# Altium integrated library Altium_WCAP-FTX2 (rev22a).IntLib: 106 symbols (part 1 of 2) (continued)
## 890324025007
designator C?, comment 39nF  (value not drawn)
WCAP-FTX2 Film Capacitor, THT, L18W5H11mm, 39nF, 275VAC; Manufacturer: Wurth Elektronik; Manufacturer Part Number: 890324025007; Capacitance Tolerance: +/-10%; Dissipation Factor @1kHz: 0.1%; Dissipation Factor @100kHz: 0.5%; Insulation Resistance: 30000MOhm; Pitch: 15mm; Rate of Voltage Rise: 300V/us; Rated Voltage (AC): 275V; Technical Reference: MX2P015393K275ASPB15000; ComponentLink1Description: Manufacturer Link; ComponentLink1URL: https://www.we-online.com/redexpert/article/890324025007?ad; ComponentLink2Description: Datasheet; ComponentLink2URL: https://www.we-online.com/redexpert/spec/890324025007?ad; Category: Film Capacitors; Match Code: WCAP-FTX2; Mount: Through Hole; Operating Temperature Max: 105°C; Operating Temperature Min: -40°C; Packaging: Carton; Length: 18mm; Width: 5mm; Height: 11mm; Capacitance: 39nF; Dissipation Factor @10kHz: 0.1%
footprint WCAP-FTX2_L18W5H11
pins: 1, 2

## 890324025007CS
designator C?, comment 39nF  (value not drawn)
WCAP-FTX2 Film Capacitor, THT, L18W5H11mm, 39nF, 275VAC; Manufacturer: Wurth Elektronik; Manufacturer Part Number: 890324025007CS; Capacitance Tolerance: +/-10%; Dissipation Factor @1kHz: 0.1%; Dissipation Factor @100kHz: 0.5%; Insulation Resistance: 30000MOhm; Pitch: 15mm; Rate of Voltage Rise: 300V/us; Rated Voltage (AC): 275V; Technical Reference: MX2P015393K275ACPP45004; ComponentLink1Description: Manufacturer Link; ComponentLink1URL: https://www.we-online.com/redexpert/article/890324025007CS?ad; ComponentLink2Description: Datasheet; ComponentLink2URL: https://www.we-online.com/redexpert/spec/890324025007CS?ad; Category: Film Capacitors; Match Code: WCAP-FTX2; Mount: Through Hole; Operating Temperature Max: 105°C; Operating Temperature Min: -40°C; Packaging: Carton; Length: 18mm; Width: 5mm; Height: 11mm; Capacitance: 39nF; Dissipation Factor @10kHz: 0.1%
footprint WCAP-FTX2_L18W5H11_CS
pins: 1, 2

## 890324025009
designator C?, comment 47nF  (value not drawn)
WCAP-FTX2 Film Capacitor, THT, L18W5H11mm, 47nF, 275VAC; Manufacturer: Wurth Elektronik; Manufacturer Part Number: 890324025009; Capacitance Tolerance: +/-10%; Dissipation Factor @1kHz: 0.1%; Dissipation Factor @100kHz: 0.5%; Insulation Resistance: 30000MOhm; Pitch: 15mm; Rate of Voltage Rise: 220V/us; Rated Voltage (AC): 275V; Technical Reference: MX2P015473K275ASPB16000; ComponentLink1Description: Manufacturer Link; ComponentLink1URL: https://www.we-online.com/redexpert/article/890324025009?ad; ComponentLink2Description: Datasheet; ComponentLink2URL: https://www.we-online.com/redexpert/spec/890324025009?ad; Category: Film Capacitors; Match Code: WCAP-FTX2; Mount: Through Hole; Operating Temperature Max: 105°C; Operating Temperature Min: -40°C; Packaging: Carton; Length: 18mm; Width: 5mm; Height: 11mm; Capacitance: 47nF; Dissipation Factor @10kHz: 0.1%
footprint WCAP-FTX2_L18W5H11
pins: 1, 2

## 890324025009CS
designator C?, comment 47nF  (value not drawn)
WCAP-FTX2 Film Capacitor, THT, L18W5H11mm, 47nF, 275VAC; Manufacturer: Wurth Elektronik; Manufacturer Part Number: 890324025009CS; Capacitance Tolerance: +/-10%; Dissipation Factor @1kHz: 0.1%; Dissipation Factor @100kHz: 0.5%; Insulation Resistance: 30000MOhm; Pitch: 15mm; Rate of Voltage Rise: 220V/us; Rated Voltage (AC): 275V; Technical Reference: MX2P015473K275ACPP46004; ComponentLink1Description: Manufacturer Link; ComponentLink1URL: https://www.we-online.com/redexpert/article/890324025009CS?ad; ComponentLink2Description: Datasheet; ComponentLink2URL: https://www.we-online.com/redexpert/spec/890324025009CS?ad; Category: Film Capacitors; Match Code: WCAP-FTX2; Mount: Through Hole; Operating Temperature Max: 105°C; Operating Temperature Min: -40°C; Packaging: Carton; Length: 18mm; Width: 5mm; Height: 11mm; Capacitance: 47nF; Dissipation Factor @10kHz: 0.1%
footprint WCAP-FTX2_L18W5H11_CS
pins: 1, 2

## 890324025011
designator C?, comment 56nF  (value not drawn)
WCAP-FTX2 Film Capacitor, THT, L18W5H11mm, 56nF, 275VAC; Manufacturer: Wurth Elektronik; Manufacturer Part Number: 890324025011; Capacitance Tolerance: +/-10%; Dissipation Factor @1kHz: 0.1%; Dissipation Factor @100kHz: 0.5%; Insulation Resistance: 30000MOhm; Pitch: 15mm; Rate of Voltage Rise: 250V/us; Rated Voltage (AC): 275V; Technical Reference: MX2P015563K275ASPB16000; ComponentLink1Description: Manufacturer Link; ComponentLink1URL: https://www.we-online.com/redexpert/article/890324025011?ad; ComponentLink2Description: Datasheet; ComponentLink2URL: https://www.we-online.com/redexpert/spec/890324025011?ad; Category: Film Capacitors; Match Code: WCAP-FTX2; Mount: Through Hole; Operating Temperature Max: 105°C; Operating Temperature Min: -40°C; Packaging: Carton; Length: 18mm; Width: 5mm; Height: 11mm; Capacitance: 56nF; Dissipation Factor @10kHz: 0.1%
footprint WCAP-FTX2_L18W5H11
pins: 1, 2

## 890324025011CS
designator C?, comment 56nF  (value not drawn)
WCAP-FTX2 Film Capacitor, THT, L18W5H11mm, 56nF, 275VAC; Manufacturer: Wurth Elektronik; Manufacturer Part Number: 890324025011CS; Capacitance Tolerance: +/-10%; Dissipation Factor @1kHz: 0.1%; Dissipation Factor @100kHz: 0.5%; Insulation Resistance: 30000MOhm; Pitch: 15mm; Rate of Voltage Rise: 250V/us; Rated Voltage (AC): 275V; Technical Reference: MX2P015563K275ACPP46004; ComponentLink1Description: Manufacturer Link; ComponentLink1URL: https://www.we-online.com/redexpert/article/890324025011CS?ad; ComponentLink2Description: Datasheet; ComponentLink2URL: https://www.we-online.com/redexpert/spec/890324025011CS?ad; Category: Film Capacitors; Match Code: WCAP-FTX2; Mount: Through Hole; Operating Temperature Max: 105°C; Operating Temperature Min: -40°C; Packaging: Carton; Length: 18mm; Width: 5mm; Height: 11mm; Capacitance: 56nF; Dissipation Factor @10kHz: 0.1%
footprint WCAP-FTX2_L18W5H11_CS
pins: 1, 2

## 890324025013
designator C?, comment 68nF  (value not drawn)
WCAP-FTX2 Film Capacitor, THT, L18W6H12mm, 68nF, 275VAC; Manufacturer: Wurth Elektronik; Manufacturer Part Number: 890324025013; Capacitance Tolerance: +/-10%; Dissipation Factor @1kHz: 0.1%; Dissipation Factor @100kHz: 0.5%; Insulation Resistance: 30000MOhm; Pitch: 15mm; Rate of Voltage Rise: 270V/us; Rated Voltage (AC): 275V; Technical Reference: MX2P015683K275ASPB16000; ComponentLink1Description: Manufacturer Link; ComponentLink1URL: https://www.we-online.com/redexpert/article/890324025013?ad; ComponentLink2Description: Datasheet; ComponentLink2URL: https://www.we-online.com/redexpert/spec/890324025013?ad; Category: Film Capacitors; Match Code: WCAP-FTX2; Mount: Through Hole; Operating Temperature Max: 105°C; Operating Temperature Min: -40°C; Packaging: Carton; Length: 18mm; Width: 6mm; Height: 12mm; Capacitance: 68nF; Dissipation Factor @10kHz: 0.1%
footprint WCAP-FTX2_L18W6H12
pins: 1, 2

## 890324025013CS
designator C?, comment 68nF  (value not drawn)
WCAP-FTX2 Film Capacitor, THT, L18W6H12mm, 68nF, 275VAC; Manufacturer: Wurth Elektronik; Manufacturer Part Number: 890324025013CS; Capacitance Tolerance: +/-10%; Dissipation Factor @1kHz: 0.1%; Dissipation Factor @100kHz: 0.5%; Insulation Resistance: 30000MOhm; Pitch: 15mm; Rate of Voltage Rise: 270V/us; Rated Voltage (AC): 275V; Technical Reference: MX2P015683K275ACPP46004; ComponentLink1Description: Manufacturer Link; ComponentLink1URL: https://www.we-online.com/redexpert/article/890324025013CS?ad; ComponentLink2Description: Datasheet; ComponentLink2URL: https://www.we-online.com/redexpert/spec/890324025013CS?ad; Category: Film Capacitors; Match Code: WCAP-FTX2; Mount: Through Hole; Operating Temperature Max: 105°C; Operating Temperature Min: -40°C; Packaging: Carton; Length: 18mm; Width: 6mm; Height: 12mm; Capacitance: 68nF; Dissipation Factor @10kHz: 0.1%
footprint WCAP-FTX2_L18W6H12_CS
pins: 1, 2

## 890324025015
designator C?, comment 82nF  (value not drawn)
WCAP-FTX2 Film Capacitor, THT, L18W6H12mm, 82nF, 275VAC; Manufacturer: Wurth Elektronik; Manufacturer Part Number: 890324025015; Capacitance Tolerance: +/-10%; Dissipation Factor @1kHz: 0.1%; Dissipation Factor @100kHz: 0.5%; Insulation Resistance: 30000MOhm; Pitch: 15mm; Rate of Voltage Rise: 290V/us; Rated Voltage (AC): 275V; Technical Reference: MX2P015823K275ASPB16000; ComponentLink1Description: Manufacturer Link; ComponentLink1URL: https://www.we-online.com/redexpert/article/890324025015?ad; ComponentLink2Description: Datasheet; ComponentLink2URL: https://www.we-online.com/redexpert/spec/890324025015?ad; Category: Film Capacitors; Match Code: WCAP-FTX2; Mount: Through Hole; Operating Temperature Max: 105°C; Operating Temperature Min: -40°C; Packaging: Carton; Length: 18mm; Width: 6mm; Height: 12mm; Capacitance: 82nF; Dissipation Factor @10kHz: 0.1%
footprint WCAP-FTX2_L18W6H12
pins: 1, 2

## 890324025015CS
designator C?, comment 82nF  (value not drawn)
WCAP-FTX2 Film Capacitor, THT, L18W6H12mm, 82nF, 275VAC; Manufacturer: Wurth Elektronik; Manufacturer Part Number: 890324025015CS; Capacitance Tolerance: +/-10%; Dissipation Factor @1kHz: 0.1%; Dissipation Factor @100kHz: 0.5%; Insulation Resistance: 30000MOhm; Pitch: 15mm; Rate of Voltage Rise: 290V/us; Rated Voltage (AC): 275V; Technical Reference: MX2P015823K275ACPP46004; ComponentLink1Description: Manufacturer Link; ComponentLink1URL: https://www.we-online.com/redexpert/article/890324025015CS?ad; ComponentLink2Description: Datasheet; ComponentLink2URL: https://www.we-online.com/redexpert/spec/890324025015CS?ad; Category: Film Capacitors; Match Code: WCAP-FTX2; Mount: Through Hole; Operating Temperature Max: 105°C; Operating Temperature Min: -40°C; Packaging: Carton; Length: 18mm; Width: 6mm; Height: 12mm; Capacitance: 82nF; Dissipation Factor @10kHz: 0.1%
footprint WCAP-FTX2_L18W6H12_CS
pins: 1, 2

## 890324025017
designator C?, comment 100nF  (value not drawn)
WCAP-FTX2 Film Capacitor, THT, L18W6H12mm, 100nF, 275VAC; Manufacturer: Wurth Elektronik; Manufacturer Part Number: 890324025017; Capacitance Tolerance: +/-10%; Dissipation Factor @1kHz: 0.1%; Dissipation Factor @100kHz: 0.5%; Insulation Resistance: 30000MOhm; Pitch: 15mm; Rate of Voltage Rise: 300V/us; Rated Voltage (AC): 275V; Technical Reference: MX2P015104K275ASPB16000; ComponentLink1Description: Manufacturer Link; ComponentLink1URL: https://www.we-online.com/redexpert/article/890324025017?ad; ComponentLink2Description: Datasheet; ComponentLink2URL: https://www.we-online.com/redexpert/spec/890324025017?ad; Category: Film Capacitors; Match Code: WCAP-FTX2; Mount: Through Hole; Operating Temperature Max: 105°C; Operating Temperature Min: -40°C; Packaging: Carton; Length: 18mm; Width: 6mm; Height: 12mm; Capacitance: 100nF; Dissipation Factor @10kHz: 0.1%
footprint WCAP-FTX2_L18W6H12
pins: 1, 2

## 890324025017CS
designator C?, comment 100nF  (value not drawn)
WCAP-FTX2 Film Capacitor, THT, L18W6H12mm, 100nF, 275VAC; Manufacturer: Wurth Elektronik; Manufacturer Part Number: 890324025017CS; Capacitance Tolerance: +/-10%; Dissipation Factor @1kHz: 0.1%; Dissipation Factor @100kHz: 0.5%; Insulation Resistance: 30000MOhm; Pitch: 15mm; Rate of Voltage Rise: 300V/us; Rated Voltage (AC): 275V; Technical Reference: MX2P015104K275ACPP46004; ComponentLink1Description: Manufacturer Link; ComponentLink1URL: https://www.we-online.com/redexpert/article/890324025017CS?ad; ComponentLink2Description: Datasheet; ComponentLink2URL: https://www.we-online.com/redexpert/spec/890324025017CS?ad; Category: Film Capacitors; Match Code: WCAP-FTX2; Mount: Through Hole; Operating Temperature Max: 105°C; Operating Temperature Min: -40°C; Packaging: Carton; Length: 18mm; Width: 6mm; Height: 12mm; Capacitance: 100nF; Dissipation Factor @10kHz: 0.1%
footprint WCAP-FTX2_L18W6H12_CS
pins: 1, 2

## 890324025020
designator C?, comment 120nF  (value not drawn)
WCAP-FTX2 Film Capacitor, THT, L18W7.5H13.5mm, 120nF, 275VAC; Manufacturer: Wurth Elektronik; Manufacturer Part Number: 890324025020; Capacitance Tolerance: +/-10%; Dissipation Factor @1kHz: 0.1%; Dissipation Factor @10kHz: 0.2%; Dissipation Factor @100kHz: 2%; Insulation Resistance: 30000MOhm; Pitch: 15mm; Rate of Voltage Rise: 300V/us; Rated Voltage (AC): 275V; Technical Reference: MX2P015124K275ASPB16000; ComponentLink1Description: Manufacturer Link; ComponentLink1URL: https://www.we-online.com/redexpert/article/890324025020?ad; ComponentLink2Description: Datasheet; ComponentLink2URL: https://www.we-online.com/redexpert/spec/890324025020?ad; Category: Film Capacitors; Match Code: WCAP-FTX2; Mount: Through Hole; Operating Temperature Max: 105°C; Operating Temperature Min: -40°C; Packaging: Carton; Length: 18mm; Width: 7.5mm; Height: 13.5mm; Capacitance: 120nF
footprint WCAP-FTX2_L18W7.5H13.5
pins: 1, 2

## 890324025020CS
designator C?, comment 120nF  (value not drawn)
WCAP-FTX2 Film Capacitor, THT, L18W7.5H13.5mm, 120nF, 275VAC; Manufacturer: Wurth Elektronik; Manufacturer Part Number: 890324025020CS; Capacitance Tolerance: +/-10%; Dissipation Factor @1kHz: 0.1%; Dissipation Factor @10kHz: 0.2%; Dissipation Factor @100kHz: 2%; Insulation Resistance: 30000MOhm; Pitch: 15mm; Rate of Voltage Rise: 300V/us; Rated Voltage (AC): 275V; Technical Reference: MX2P015124K275ACPP46004; ComponentLink1Description: Manufacturer Link; ComponentLink1URL: https://www.we-online.com/redexpert/article/890324025020CS?ad; ComponentLink2Description: Datasheet; ComponentLink2URL: https://www.we-online.com/redexpert/spec/890324025020CS?ad; Category: Film Capacitors; Match Code: WCAP-FTX2; Mount: Through Hole; Operating Temperature Max: 105°C; Operating Temperature Min: -40°C; Packaging: Carton; Length: 18mm; Width: 7.5mm; Height: 13.5mm; Capacitance: 120nF
footprint WCAP-FTX2_L18W7.5H13.5_CS
pins: 1, 2

## 890324025022
designator C?, comment 150nF  (value not drawn)
WCAP-FTX2 Film Capacitor, THT, L18W6H12mm, 150nF, 275VAC; Manufacturer: Wurth Elektronik; Manufacturer Part Number: 890324025022; Capacitance Tolerance: +/-10%; Dissipation Factor @1kHz: 0.1%; Dissipation Factor @10kHz: 0.2%; Dissipation Factor @100kHz: 2%; Insulation Resistance: 30000MOhm; Pitch: 15mm; Rate of Voltage Rise: 210V/us; Rated Voltage (AC): 275V; Technical Reference: MX2P015154K275ASPB16000; ComponentLink1Description: Manufacturer Link; ComponentLink1URL: https://www.we-online.com/redexpert/article/890324025022?ad; ComponentLink2Description: Datasheet; ComponentLink2URL: https://www.we-online.com/redexpert/spec/890324025022?ad; Category: Film Capacitors; Match Code: WCAP-FTX2; Mount: Through Hole; Operating Temperature Max: 105°C; Operating Temperature Min: -40°C; Packaging: Carton; Length: 18mm; Width: 6mm; Height: 12mm; Capacitance: 150nF
footprint WCAP-FTX2_L18W6H12
pins: 1, 2

## 890324025022CS
designator C?, comment 150nF  (value not drawn)
WCAP-FTX2 Film Capacitor, THT, L18W6H12mm, 150nF, 275VAC; Manufacturer: Wurth Elektronik; Manufacturer Part Number: 890324025022CS; Capacitance Tolerance: +/-10%; Dissipation Factor @1kHz: 0.1%; Dissipation Factor @10kHz: 0.2%; Dissipation Factor @100kHz: 2%; Insulation Resistance: 30000MOhm; Pitch: 15mm; Rate of Voltage Rise: 210V/us; Rated Voltage (AC): 275V; Technical Reference: MX2P015154K275ACPP46004; ComponentLink1Description: Manufacturer Link; ComponentLink1URL: https://www.we-online.com/redexpert/article/890324025022CS?ad; ComponentLink2Description: Datasheet; ComponentLink2URL: https://www.we-online.com/redexpert/spec/890324025022CS?ad; Category: Film Capacitors; Match Code: WCAP-FTX2; Mount: Through Hole; Operating Temperature Max: 105°C; Operating Temperature Min: -40°C; Packaging: Carton; Length: 18mm; Width: 6mm; Height: 12mm; Capacitance: 150nF
footprint WCAP-FTX2_L18W6H12_CS
pins: 1, 2

## 890324025025
designator C?, comment 180nF  (value not drawn)
WCAP-FTX2 Film Capacitor, THT, L18W6H12mm, 180nF, 275VAC; Manufacturer: Wurth Elektronik; Manufacturer Part Number: 890324025025; Capacitance Tolerance: +/-10%; Dissipation Factor @1kHz: 0.1%; Dissipation Factor @10kHz: 0.2%; Dissipation Factor @100kHz: 2%; Insulation Resistance: 30000MOhm; Pitch: 15mm; Rate of Voltage Rise: 230V/us; Rated Voltage (AC): 275V; Technical Reference: MX2P015184K275ASPB15000; ComponentLink1Description: Manufacturer Link; ComponentLink1URL: https://www.we-online.com/redexpert/article/890324025025?ad; ComponentLink2Description: Datasheet; ComponentLink2URL: https://www.we-online.com/redexpert/spec/890324025025?ad; Category: Film Capacitors; Match Code: WCAP-FTX2; Mount: Through Hole; Operating Temperature Max: 105°C; Operating Temperature Min: -40°C; Packaging: Carton; Length: 18mm; Width: 6mm; Height: 12mm; Capacitance: 180nF
footprint WCAP-FTX2_L18W6H12
pins: 1, 2

## 890324025025CS
designator C?, comment 180nF  (value not drawn)
WCAP-FTX2 Film Capacitor, THT, L18W6H12mm, 180nF, 275VAC; Manufacturer: Wurth Elektronik; Manufacturer Part Number: 890324025025CS; Capacitance Tolerance: +/-10%; Dissipation Factor @1kHz: 0.1%; Dissipation Factor @10kHz: 0.2%; Dissipation Factor @100kHz: 2%; Insulation Resistance: 30000MOhm; Pitch: 15mm; Rate of Voltage Rise: 230V/us; Rated Voltage (AC): 275V; Technical Reference: MX2P015184K275ACPP45004; ComponentLink1Description: Manufacturer Link; ComponentLink1URL: https://www.we-online.com/redexpert/article/890324025025CS?ad; ComponentLink2Description: Datasheet; ComponentLink2URL: https://www.we-online.com/redexpert/spec/890324025025CS?ad; Category: Film Capacitors; Match Code: WCAP-FTX2; Mount: Through Hole; Operating Temperature Max: 105°C; Operating Temperature Min: -40°C; Packaging: Carton; Length: 18mm; Width: 6mm; Height: 12mm; Capacitance: 180nF
footprint WCAP-FTX2_L18W6H12_CS
pins: 1, 2

## 890324025027
designator C?, comment 220nF  (value not drawn)
WCAP-FTX2 Film Capacitor, THT, L18W6H11.5mm, 220nF, 275VAC; Manufacturer: Wurth Elektronik; Manufacturer Part Number: 890324025027; Capacitance Tolerance: +/-10%; Dissipation Factor @1kHz: 0.1%; Dissipation Factor @10kHz: 0.2%; Dissipation Factor @100kHz: 2%; Insulation Resistance: 30000MOhm; Pitch: 15mm; Rate of Voltage Rise: 180V/us; Rated Voltage (AC): 275V; Technical Reference: MX2P015224K275ASPB15000; ComponentLink1Description: Manufacturer Link; ComponentLink1URL: https://www.we-online.com/redexpert/article/890324025027?ad; ComponentLink2Description: Datasheet; ComponentLink2URL: https://www.we-online.com/redexpert/spec/890324025027?ad; Category: Film Capacitors; Match Code: WCAP-FTX2; Mount: Through Hole; Operating Temperature Max: 105°C; Operating Temperature Min: -40°C; Packaging: Carton; Length: 18mm; Width: 6mm; Height: 11.5mm; Capacitance: 220nF
footprint WCAP-FTX2_L18W6H11.5
pins: 1, 2

## 890324025027CS
designator C?, comment 220nF  (value not drawn)
WCAP-FTX2 Film Capacitor, THT, L18W6H11.5mm, 220nF, 275VAC; Manufacturer: Wurth Elektronik; Manufacturer Part Number: 890324025027CS; Capacitance Tolerance: +/-10%; Dissipation Factor @1kHz: 0.1%; Dissipation Factor @10kHz: 0.2%; Dissipation Factor @100kHz: 2%; Insulation Resistance: 30000MOhm; Pitch: 15mm; Rate of Voltage Rise: 180V/us; Rated Voltage (AC): 275V; Technical Reference: MX2P015224K275ACPP45004; ComponentLink1Description: Manufacturer Link; ComponentLink1URL: https://www.we-online.com/redexpert/article/890324025027CS?ad; ComponentLink2Description: Datasheet; ComponentLink2URL: https://www.we-online.com/redexpert/spec/890324025027CS?ad; Category: Film Capacitors; Match Code: WCAP-FTX2; Mount: Through Hole; Operating Temperature Max: 105°C; Operating Temperature Min: -40°C; Packaging: Carton; Length: 18mm; Width: 6mm; Height: 11.5mm; Capacitance: 220nF
footprint WCAP-FTX2_L18W6H11.5_CS
pins: 1, 2

## 890324025031
designator C?, comment 270nF  (value not drawn)
WCAP-FTX2 Film Capacitor, THT, L18W7.5H14.5mm, 270nF, 275VAC; Manufacturer: Wurth Elektronik; Manufacturer Part Number: 890324025031; Capacitance Tolerance: +/-10%; Dissipation Factor @1kHz: 0.1%; Dissipation Factor @10kHz: 0.2%; Dissipation Factor @100kHz: 2%; Insulation Resistance: 30000MOhm; Pitch: 15mm; Rate of Voltage Rise: 250V/us; Rated Voltage (AC): 275V; Technical Reference: MX2P015274K275ASPB15000; ComponentLink1Description: Manufacturer Link; ComponentLink1URL: https://www.we-online.com/redexpert/article/890324025031?ad; ComponentLink2Description: Datasheet; ComponentLink2URL: https://www.we-online.com/redexpert/spec/890324025031?ad; Category: Film Capacitors; Match Code: WCAP-FTX2; Mount: Through Hole; Operating Temperature Max: 105°C; Operating Temperature Min: -40°C; Packaging: Carton; Length: 18mm; Width: 7.5mm; Height: 14.5mm; Capacitance: 270nF
footprint WCAP-FTX2_L18W7.5H14.5
pins: 1, 2

## 890324025031CS
designator C?, comment 270nF  (value not drawn)
WCAP-FTX2 Film Capacitor, THT, L18W7.5H14.5mm, 270nF, 275VAC; Manufacturer: Wurth Elektronik; Manufacturer Part Number: 890324025031CS; Capacitance Tolerance: +/-10%; Dissipation Factor @1kHz: 0.1%; Dissipation Factor @10kHz: 0.2%; Dissipation Factor @100kHz: 2%; Insulation Resistance: 30000MOhm; Pitch: 15mm; Rate of Voltage Rise: 250V/us; Rated Voltage (AC): 275V; Technical Reference: MX2P015274K275ACPP45004; ComponentLink1Description: Manufacturer Link; ComponentLink1URL: https://www.we-online.com/redexpert/article/890324025031CS?ad; ComponentLink2Description: Datasheet; ComponentLink2URL: https://www.we-online.com/redexpert/spec/890324025031CS?ad; Category: Film Capacitors; Match Code: WCAP-FTX2; Mount: Through Hole; Operating Temperature Max: 105°C; Operating Temperature Min: -40°C; Packaging: Carton; Length: 18mm; Width: 7.5mm; Height: 14.5mm; Capacitance: 270nF
footprint WCAP-FTX2_L18W7.5H14.5_CS
pins: 1, 2

## 890324025034
designator C?, comment 330nF  (value not drawn)
WCAP-FTX2 Film Capacitor, THT, L18W8.5H14.5mm, 330nF, 275VAC; Manufacturer: Wurth Elektronik; Manufacturer Part Number: 890324025034; Capacitance Tolerance: +/-10%; Dissipation Factor @1kHz: 0.1%; Dissipation Factor @10kHz: 0.2%; Dissipation Factor @100kHz: 2%; Insulation Resistance: 30000MOhm; Pitch: 15mm; Rate of Voltage Rise: 260V/us; Rated Voltage (AC): 275V; Technical Reference: MX2P015334K275ASPB16000; ComponentLink1Description: Manufacturer Link; ComponentLink1URL: https://www.we-online.com/redexpert/article/890324025034?ad; ComponentLink2Description: Datasheet; ComponentLink2URL: https://www.we-online.com/redexpert/spec/890324025034?ad; Category: Film Capacitors; Match Code: WCAP-FTX2; Mount: Through Hole; Operating Temperature Max: 105°C; Operating Temperature Min: -40°C; Packaging: Carton; Length: 18mm; Width: 8.5mm; Height: 14.5mm; Capacitance: 330nF
footprint WCAP-FTX2_L18W8.5H14.5
pins: 1, 2

## 890324025034CS
designator C?, comment 330nF  (value not drawn)
WCAP-FTX2 Film Capacitor, THT, L18W8.5H14.5mm, 330nF, 275VAC; Manufacturer: Wurth Elektronik; Manufacturer Part Number: 890324025034CS; Capacitance Tolerance: +/-10%; Dissipation Factor @1kHz: 0.1%; Dissipation Factor @10kHz: 0.2%; Dissipation Factor @100kHz: 2%; Insulation Resistance: 30000MOhm; Pitch: 15mm; Rate of Voltage Rise: 260V/us; Rated Voltage (AC): 275V; Technical Reference: MX2P015334K275ACPP46004; ComponentLink1Description: Manufacturer Link; ComponentLink1URL: https://www.we-online.com/redexpert/article/890324025034CS?ad; ComponentLink2Description: Datasheet; ComponentLink2URL: https://www.we-online.com/redexpert/spec/890324025034CS?ad; Category: Film Capacitors; Match Code: WCAP-FTX2; Mount: Through Hole; Operating Temperature Max: 105°C; Operating Temperature Min: -40°C; Packaging: Carton; Length: 18mm; Width: 8.5mm; Height: 14.5mm; Capacitance: 330nF
footprint WCAP-FTX2_L18W8.5H14.5_CS
pins: 1, 2

## 890324025039
designator C?, comment 470nF  (value not drawn)
WCAP-FTX2 Film Capacitor, THT, L18W8H14mm, 470nF, 275VAC; Manufacturer: Wurth Elektronik; Manufacturer Part Number: 890324025039; Capacitance Tolerance: +/-10%; Dissipation Factor @1kHz: 0.1%; Dissipation Factor @10kHz: 0.2%; Dissipation Factor @100kHz: 2%; Insulation Resistance: 10000Ohm x F; Pitch: 15mm; Rate of Voltage Rise: 220V/us; Rated Voltage (AC): 275V; Technical Reference: MX2P015474K275ASPB16000; ComponentLink1Description: Manufacturer Link; ComponentLink1URL: https://www.we-online.com/redexpert/article/890324025039?ad; ComponentLink2Description: Datasheet; ComponentLink2URL: https://www.we-online.com/redexpert/spec/890324025039?ad; Category: Film Capacitors; Match Code: WCAP-FTX2; Mount: Through Hole; Operating Temperature Max: 105°C; Operating Temperature Min: -40°C; Packaging: Carton; Length: 18mm; Width: 8mm; Height: 14mm; Capacitance: 470nF
footprint WCAP-FTX2_L18W8H14
pins: 1, 2

## 890324025039CS
designator C?, comment 470nF  (value not drawn)
WCAP-FTX2 Film Capacitor, THT, L18W8H14mm, 470nF, 275VAC; Manufacturer: Wurth Elektronik; Manufacturer Part Number: 890324025039CS; Capacitance Tolerance: +/-10%; Dissipation Factor @1kHz: 0.1%; Dissipation Factor @10kHz: 0.2%; Dissipation Factor @100kHz: 2%; Insulation Resistance: 10000Ohm x F; Pitch: 15mm; Rate of Voltage Rise: 220V/us; Rated Voltage (AC): 275V; Technical Reference: MX2P015474K275ACPP46004; ComponentLink1Description: Manufacturer Link; ComponentLink1URL: https://www.we-online.com/redexpert/article/890324025039CS?ad; ComponentLink2Description: Datasheet; ComponentLink2URL: https://www.we-online.com/redexpert/spec/890324025039CS?ad; Category: Film Capacitors; Match Code: WCAP-FTX2; Mount: Through Hole; Operating Temperature Max: 105°C; Operating Temperature Min: -40°C; Packaging: Carton; Length: 18mm; Width: 8mm; Height: 14mm; Capacitance: 470nF
footprint WCAP-FTX2_L18W8H14_CS
pins: 1, 2

## 890324025043
designator C?, comment 560nF  (value not drawn)
WCAP-FTX2 Film Capacitor, THT, L18W9H15mm, 560nF, 275VAC; Manufacturer: Wurth Elektronik; Manufacturer Part Number: 890324025043; Capacitance Tolerance: +/-10%; Dissipation Factor @1kHz: 0.1%; Dissipation Factor @10kHz: 0.7%; Insulation Resistance: 10000Ohm x F; Pitch: 15mm; Rate of Voltage Rise: 220V/us; Rated Voltage (AC): 275V; Technical Reference: MX2P015564K275ASPB15000; ComponentLink1Description: Manufacturer Link; ComponentLink1URL: https://www.we-online.com/redexpert/article/890324025043?ad; ComponentLink2Description: Datasheet; ComponentLink2URL: https://www.we-online.com/redexpert/spec/890324025043?ad; Category: Film Capacitors; Match Code: WCAP-FTX2; Mount: Through Hole; Operating Temperature Max: 105°C; Operating Temperature Min: -40°C; Packaging: Carton; Length: 18mm; Width: 9mm; Height: 15mm; Capacitance: 560nF
footprint WCAP-FTX2_L18W9H15
pins: 1, 2

## 890324025043CS
designator C?, comment 560nF  (value not drawn)
WCAP-FTX2 Film Capacitor, THT, L18W9H15mm, 560nF, 275VAC; Manufacturer: Wurth Elektronik; Manufacturer Part Number: 890324025043CS; Capacitance Tolerance: +/-10%; Dissipation Factor @1kHz: 0.1%; Dissipation Factor @10kHz: 0.7%; Insulation Resistance: 10000Ohm x F; Pitch: 15mm; Rate of Voltage Rise: 220V/us; Rated Voltage (AC): 275V; Technical Reference: MX2P015564K275ACPP45004; ComponentLink1Description: Manufacturer Link; ComponentLink1URL: https://www.we-online.com/redexpert/article/890324025043CS?ad; ComponentLink2Description: Datasheet; ComponentLink2URL: https://www.we-online.com/redexpert/spec/890324025043CS?ad; Category: Film Capacitors; Match Code: WCAP-FTX2; Mount: Through Hole; Operating Temperature Max: 105°C; Operating Temperature Min: -40°C; Packaging: Carton; Length: 18mm; Width: 9mm; Height: 15mm; Capacitance: 560nF
footprint WCAP-FTX2_L18W9H15_CS
pins: 1, 2

## 890324025045
designator C?, comment 680nF  (value not drawn)
WCAP-FTX2 Film Capacitor, THT, L18W10H16mm, 680nF, 275VAC; Manufacturer: Wurth Elektronik; Manufacturer Part Number: 890324025045; Capacitance Tolerance: +/-10%; Dissipation Factor @1kHz: 0.1%; Dissipation Factor @10kHz: 0.2%; Insulation Resistance: 10000Ohm x F; Pitch: 15mm; Rate of Voltage Rise: 230V/us; Rated Voltage (AC): 275V; Technical Reference: MX2P015684K275ASPB15000; ComponentLink1Description: Manufacturer Link; ComponentLink1URL: https://www.we-online.com/redexpert/article/890324025045?ad; ComponentLink2Description: Datasheet; ComponentLink2URL: https://www.we-online.com/redexpert/spec/890324025045?ad; Category: Film Capacitors; Match Code: WCAP-FTX2; Mount: Through Hole; Operating Temperature Max: 105°C; Operating Temperature Min: -40°C; Packaging: Carton; Length: 18mm; Width: 10mm; Height: 16mm; Capacitance: 680nF
footprint WCAP-FTX2_L18W10H16
pins: 1, 2

## 890324025045CS
designator C?, comment 680nF  (value not drawn)
WCAP-FTX2 Film Capacitor, THT, L18W10H16mm, 680nF, 275VAC; Manufacturer: Wurth Elektronik; Manufacturer Part Number: 890324025045CS; Capacitance Tolerance: +/-10%; Dissipation Factor @1kHz: 0.1%; Dissipation Factor @10kHz: 0.7%; Insulation Resistance: 10000Ohm x F; Pitch: 15mm; Rate of Voltage Rise: 230V/us; Rated Voltage (AC): 275V; Technical Reference: MX2P015684K275ACPP45004; ComponentLink1Description: Manufacturer Link; ComponentLink1URL: https://www.we-online.com/redexpert/article/890324025045CS?ad; ComponentLink2Description: Datasheet; ComponentLink2URL: https://www.we-online.com/redexpert/spec/890324025045CS?ad; Category: Film Capacitors; Match Code: WCAP-FTX2; Mount: Through Hole; Operating Temperature Max: 105°C; Operating Temperature Min: -40°C; Packaging: Carton; Length: 18mm; Width: 10mm; Height: 16mm; Capacitance: 680nF
footprint WCAP-FTX2_L18W10H16_CS
pins: 1, 2

## 890324025047CS
designator C?, comment 820nF  (value not drawn)
WCAP-FTX2 Film Capacitor, THT, L18W10H17.5mm, 820nF, 275VAC; Manufacturer: Wurth Elektronik; Manufacturer Part Number: 890324025047CS; Capacitance Tolerance: +/-10%; Dissipation Factor @1kHz: 0.1%; Dissipation Factor @10kHz: 0.7%; Insulation Resistance: 10000Ohm x F; Pitch: 15mm; Rate of Voltage Rise: 230V/us; Rated Voltage (AC): 275V; Technical Reference: MX2P015824K275ACPP35004; ComponentLink1Description: Manufacturer Link; ComponentLink1URL: https://www.we-online.com/redexpert/article/890324025047CS?ad; ComponentLink2Description: Datasheet; ComponentLink2URL: https://www.we-online.com/redexpert/spec/890324025047CS?ad; Category: Film Capacitors; Match Code: WCAP-FTX2; Mount: Through Hole; Operating Temperature Max: 105°C; Operating Temperature Min: -40°C; Packaging: Carton; Length: 18mm; Width: 10mm; Height: 17.5mm; Capacitance: 820nF
footprint WCAP-FTX2_L18W10H17.5_CS
pins: 1, 2

## 890324026003
designator C?, comment 220nF  (value not drawn)
WCAP-FTX2 Film Capacitor, THT, L26W6H15mm, 220nF, 275VAC; Manufacturer: Wurth Elektronik; Manufacturer Part Number: 890324026003; Capacitance Tolerance: +/-10%; Dissipation Factor @1kHz: 0.1%; Dissipation Factor @10kHz: 0.2%; Dissipation Factor @100kHz: 2%; Insulation Resistance: 30000MOhm; Pitch: 22.5mm; Rate of Voltage Rise: 160V/us; Rated Voltage (AC): 275V; Technical Reference: MX2P225224K275ASPB46000; ComponentLink1Description: Manufacturer Link; ComponentLink1URL: https://www.we-online.com/redexpert/article/890324026003?ad; ComponentLink2Description: Datasheet; ComponentLink2URL: https://www.we-online.com/redexpert/spec/890324026003?ad; Category: Film Capacitors; Match Code: WCAP-FTX2; Mount: Through Hole; Operating Temperature Max: 105°C; Operating Temperature Min: -40°C; Packaging: Carton; Length: 26mm; Width: 6mm; Height: 15mm; Capacitance: 220nF
footprint WCAP-FTX2_L26W6H15
pins: 1, 2

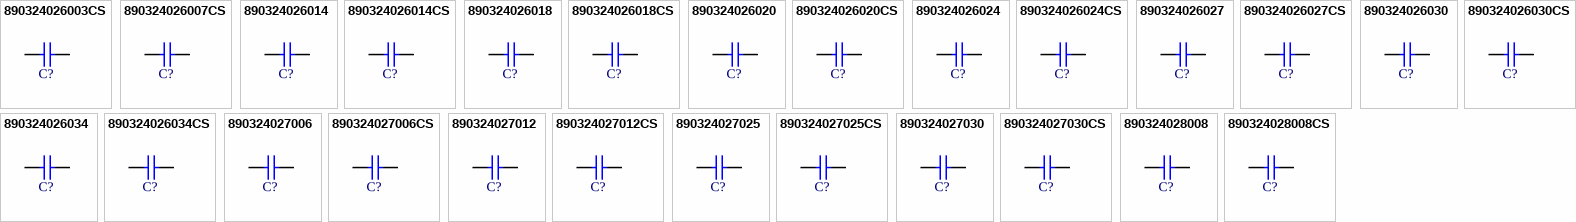
[diagram p2: symbols 890324026003CS to 890324028008CS]

## 890324026003CS
designator C?, comment 220nF  (value not drawn)
WCAP-FTX2 Film Capacitor, THT, L26W6H15mm, 220nF, 275VAC; Manufacturer: Wurth Elektronik; Manufacturer Part Number: 890324026003CS; Capacitance Tolerance: +/-10%; Dissipation Factor @1kHz: 0.1%; Dissipation Factor @10kHz: 0.2%; Dissipation Factor @100kHz: 2%; Insulation Resistance: 30000MOhm; Pitch: 22.5mm; Rate of Voltage Rise: 160V/us; Rated Voltage (AC): 275V; Technical Reference: MX2P225224K275ACPP46004; ComponentLink1Description: Manufacturer Link; ComponentLink1URL: https://www.we-online.com/redexpert/article/890324026003CS?ad; ComponentLink2Description: Datasheet; ComponentLink2URL: https://www.we-online.com/redexpert/spec/890324026003CS?ad; Category: Film Capacitors; Match Code: WCAP-FTX2; Mount: Through Hole; Operating Temperature Max: 105°C; Operating Temperature Min: -40°C; Packaging: Carton; Length: 26mm; Width: 6mm; Height: 15mm; Capacitance: 220nF
footprint WCAP-FTX2_L26W6H15_CS
pins: 1, 2

## 890324026007CS
designator C?, comment 330nF  (value not drawn)
WCAP-FTX2 Film Capacitor, THT, L26W6H12mm, 330nF, 275VAC; Manufacturer: Wurth Elektronik; Manufacturer Part Number: 890324026007CS; Capacitance Tolerance: +/-10%; Dissipation Factor @1kHz: 0.1%; Dissipation Factor @10kHz: 0.2%; Dissipation Factor @100kHz: 2%; Insulation Resistance: 30000MOhm; Pitch: 22.5mm; Rate of Voltage Rise: 140V/us; Rated Voltage (AC): 275V; Technical Reference: MX2P225334K275ACPP45004; ComponentLink1Description: Manufacturer Link; ComponentLink1URL: https://www.we-online.com/redexpert/article/890324026007CS?ad; ComponentLink2Description: Datasheet; ComponentLink2URL: https://www.we-online.com/redexpert/spec/890324026007CS?ad; Category: Film Capacitors; Match Code: WCAP-FTX2; Mount: Through Hole; Operating Temperature Max: 105°C; Operating Temperature Min: -40°C; Packaging: Carton; Length: 26mm; Width: 6mm; Height: 12mm; Capacitance: 330nF
footprint WCAP-FTX2_L26W6H12_CS
pins: 1, 2

## 890324026014
designator C?, comment 0.47uF  (value not drawn)
WCAP-FTX2 Film Capacitor, THT, L26W6.5H14.5mm, 0.47uF, 275VAC; Manufacturer: Wurth Elektronik; Manufacturer Part Number: 890324026014; Capacitance Tolerance: +/-10%; Dissipation Factor @1kHz: 0.1%; Dissipation Factor @10kHz: 0.2%; Dissipation Factor @100kHz: 2%; Insulation Resistance: 10000Ohm x F; Pitch: 22.5mm; Rate of Voltage Rise: 150V/us; Rated Voltage (AC): 275V; Technical Reference: MX2P225474K275ASPB45000; ComponentLink1Description: Manufacturer Link; ComponentLink1URL: https://www.we-online.com/redexpert/article/890324026014?ad; ComponentLink2Description: Datasheet; ComponentLink2URL: https://www.we-online.com/redexpert/spec/890324026014?ad; Category: Film Capacitors; Match Code: WCAP-FTX2; Mount: Through Hole; Operating Temperature Max: 105°C; Operating Temperature Min: -40°C; Packaging: Carton; Length: 26mm; Width: 6.5mm; Height: 14.5mm; Capacitance: 0.47uF
footprint WCAP-FTX2_L26W6.5H14.5
pins: 1, 2

## 890324026014CS
designator C?, comment 0.47nF  (value not drawn)
WCAP-FTX2 Film Capacitor, THT, L26W6.5H14.5mm, 0.47nF, 275VAC; Manufacturer: Wurth Elektronik; Manufacturer Part Number: 890324026014CS; Capacitance Tolerance: +/-10%; Dissipation Factor @1kHz: 0.1%; Dissipation Factor @10kHz: 0.2%; Dissipation Factor @100kHz: 2%; Insulation Resistance: 10000Ohm x F; Pitch: 22.5mm; Rate of Voltage Rise: 150V/us; Rated Voltage (AC): 275V; Technical Reference: MX2P225474K275ACPP45004; ComponentLink1Description: Manufacturer Link; ComponentLink1URL: https://www.we-online.com/redexpert/article/890324026014CS?ad; ComponentLink2Description: Datasheet; ComponentLink2URL: https://www.we-online.com/redexpert/spec/890324026014CS?ad; Category: Film Capacitors; Match Code: WCAP-FTX2; Mount: Through Hole; Operating Temperature Max: 105°C; Operating Temperature Min: -40°C; Packaging: Carton; Length: 26mm; Width: 6.5mm; Height: 14.5mm; Capacitance: 0.47nF
footprint WCAP-FTX2_L26W6.5H14.5_CS
pins: 1, 2

## 890324026018
designator C?, comment 560nF  (value not drawn)
WCAP-FTX2 Film Capacitor, THT, L26W7.5H16.5mm, 560nF, 275VAC; Manufacturer: Wurth Elektronik; Manufacturer Part Number: 890324026018; Capacitance Tolerance: +/-10%; Dissipation Factor @1kHz: 0.1%; Dissipation Factor @10kHz: 0.7%; Insulation Resistance: 10000Ohm x F; Pitch: 22.5mm; Rate of Voltage Rise: 160V/us; Rated Voltage (AC): 275V; Technical Reference: MX2P225564K275ASPB46000; ComponentLink1Description: Manufacturer Link; ComponentLink1URL: https://www.we-online.com/redexpert/article/890324026018?ad; ComponentLink2Description: Datasheet; ComponentLink2URL: https://www.we-online.com/redexpert/spec/890324026018?ad; Category: Film Capacitors; Match Code: WCAP-FTX2; Mount: Through Hole; Operating Temperature Max: 105°C; Operating Temperature Min: -40°C; Packaging: Carton; Length: 26mm; Width: 7.5mm; Height: 16.5mm; Capacitance: 560nF
footprint WCAP-FTX2_L26W7.5H16.5
pins: 1, 2

## 890324026018CS
designator C?, comment 560nF  (value not drawn)
WCAP-FTX2 Film Capacitor, THT, L26W7.5H16.5mm, 560nF, 275VAC; Manufacturer: Wurth Elektronik; Manufacturer Part Number: 890324026018CS; Capacitance Tolerance: +/-10%; Dissipation Factor @1kHz: 0.1%; Dissipation Factor @10kHz: 0.7%; Insulation Resistance: 10000Ohm x F; Pitch: 22.5mm; Rate of Voltage Rise: 160V/us; Rated Voltage (AC): 275V; Technical Reference: MX2P225564K275ACPP36004; ComponentLink1Description: Manufacturer Link; ComponentLink1URL: https://www.we-online.com/redexpert/article/890324026018CS?ad; ComponentLink2Description: Datasheet; ComponentLink2URL: https://www.we-online.com/redexpert/spec/890324026018CS?ad; Category: Film Capacitors; Match Code: WCAP-FTX2; Mount: Through Hole; Operating Temperature Max: 105°C; Operating Temperature Min: -40°C; Packaging: Carton; Length: 26mm; Width: 7.5mm; Height: 16.5mm; Capacitance: 560nF
footprint WCAP-FTX2_L26W7.5H16.5_CS
pins: 1, 2

## 890324026020
designator C?, comment 680nF  (value not drawn)
WCAP-FTX2 Film Capacitor, THT, L26W7.5H15mm, 680nF, 275VAC; Manufacturer: Wurth Elektronik; Manufacturer Part Number: 890324026020; Capacitance Tolerance: +/-10%; Dissipation Factor @1kHz: 0.1%; Dissipation Factor @10kHz: 0.7%; Insulation Resistance: 10000Ohm x F; Pitch: 22.5mm; Rate of Voltage Rise: 130V/us; Rated Voltage (AC): 275V; Technical Reference: MX2P225684K275ASPB45000; ComponentLink1Description: Manufacturer Link; ComponentLink1URL: https://www.we-online.com/redexpert/article/890324026020?ad; ComponentLink2Description: Datasheet; ComponentLink2URL: https://www.we-online.com/redexpert/spec/890324026020?ad; Category: Film Capacitors; Match Code: WCAP-FTX2; Mount: Through Hole; Operating Temperature Max: 105°C; Operating Temperature Min: -40°C; Packaging: Carton; Length: 26mm; Width: 7.5mm; Height: 15mm; Capacitance: 680nF
footprint WCAP-FTX2_L26W7.5H15
pins: 1, 2

## 890324026020CS
designator C?, comment 680nF  (value not drawn)
WCAP-FTX2 Film Capacitor, THT, L26W7.5H15mm, 680nF, 275VAC; Manufacturer: Wurth Elektronik; Manufacturer Part Number: 890324026020CS; Capacitance Tolerance: +/-10%; Dissipation Factor @1kHz: 0.1%; Dissipation Factor @10kHz: 0.7%; Insulation Resistance: 10000Ohm x F; Pitch: 22.5mm; Rate of Voltage Rise: 130V/us; Rated Voltage (AC): 275V; Technical Reference: MX2P225684K275ACPP45004; ComponentLink1Description: Manufacturer Link; ComponentLink1URL: https://www.we-online.com/redexpert/article/890324026020CS?ad; ComponentLink2Description: Datasheet; ComponentLink2URL: https://www.we-online.com/redexpert/spec/890324026020CS?ad; Category: Film Capacitors; Match Code: WCAP-FTX2; Mount: Through Hole; Operating Temperature Max: 105°C; Operating Temperature Min: -40°C; Packaging: Carton; Length: 26mm; Width: 7.5mm; Height: 15mm; Capacitance: 680nF
footprint WCAP-FTX2_L26W7.5H15_CS
pins: 1, 2

## 890324026024
designator C?, comment 820nF  (value not drawn)
WCAP-FTX2 Film Capacitor, THT, L26W9H18mm, 820nF, 275VAC; Manufacturer: Wurth Elektronik; Manufacturer Part Number: 890324026024; Capacitance Tolerance: +/-10%; Dissipation Factor @1kHz: 0.1%; Dissipation Factor @10kHz: 0.7%; Insulation Resistance: 10000Ohm x F; Pitch: 22.5mm; Rate of Voltage Rise: 160V/us; Rated Voltage (AC): 275V; Technical Reference: MX2P225824K275ASPB46000; ComponentLink1Description: Manufacturer Link; ComponentLink1URL: https://www.we-online.com/redexpert/article/890324026024?ad; ComponentLink2Description: Datasheet; ComponentLink2URL: https://www.we-online.com/redexpert/spec/890324026024?ad; Category: Film Capacitors; Match Code: WCAP-FTX2; Mount: Through Hole; Operating Temperature Max: 105°C; Operating Temperature Min: -40°C; Packaging: Carton; Length: 26mm; Width: 9mm; Height: 18mm; Capacitance: 820nF
footprint WCAP-FTX2_L26W9H18
pins: 1, 2

## 890324026024CS
designator C?, comment 820nF  (value not drawn)
WCAP-FTX2 Film Capacitor, THT, L26W9H18mm, 820nF, 275VAC; Manufacturer: Wurth Elektronik; Manufacturer Part Number: 890324026024CS; Capacitance Tolerance: +/-10%; Dissipation Factor @1kHz: 0.1%; Dissipation Factor @10kHz: 0.7%; Insulation Resistance: 10000Ohm x F; Pitch: 22.5mm; Rate of Voltage Rise: 160V/us; Rated Voltage (AC): 275V; Technical Reference: MX2P225824K275ACPP36004; ComponentLink1Description: Manufacturer Link; ComponentLink1URL: https://www.we-online.com/redexpert/article/890324026024CS?ad; ComponentLink2Description: Datasheet; ComponentLink2URL: https://www.we-online.com/redexpert/spec/890324026024CS?ad; Category: Film Capacitors; Match Code: WCAP-FTX2; Mount: Through Hole; Operating Temperature Max: 105°C; Operating Temperature Min: -40°C; Packaging: Carton; Length: 26mm; Width: 9mm; Height: 18mm; Capacitance: 820nF
footprint WCAP-FTX2_L26W9H18_CS
pins: 1, 2

## 890324026027
designator C?, comment 1uF  (value not drawn)
WCAP-FTX2 Film Capacitor, THT, L26W11H20mm, 1uF, 275VAC; Manufacturer: Wurth Elektronik; Manufacturer Part Number: 890324026027; Capacitance Tolerance: +/-10%; Dissipation Factor @1kHz: 0.1%; Dissipation Factor @10kHz: 0.7%; Insulation Resistance: 10000Ohm x F; Pitch: 22.5mm; Rate of Voltage Rise: 170V/us; Rated Voltage (AC): 275V; Technical Reference: MX2P225105K275ASPB46000; ComponentLink1Description: Manufacturer Link; ComponentLink1URL: https://www.we-online.com/redexpert/article/890324026027?ad; ComponentLink2Description: Datasheet; ComponentLink2URL: https://www.we-online.com/redexpert/spec/890324026027?ad; Category: Film Capacitors; Match Code: WCAP-FTX2; Mount: Through Hole; Operating Temperature Max: 105°C; Operating Temperature Min: -40°C; Packaging: Carton; Length: 26mm; Width: 11mm; Height: 20mm; Capacitance: 1uF
footprint WCAP-FTX2_L26W11H20
pins: 1, 2

## 890324026027CS
designator C?, comment 1uF  (value not drawn)
WCAP-FTX2 Film Capacitor, THT, L26W11H20mm, 1uF, 275VAC; Manufacturer: Wurth Elektronik; Manufacturer Part Number: 890324026027CS; Capacitance Tolerance: +/-10%; Dissipation Factor @1kHz: 0.1%; Dissipation Factor @10kHz: 0.7%; Insulation Resistance: 10000Ohm x F; Pitch: 22.5mm; Rate of Voltage Rise: 170V/us; Rated Voltage (AC): 275V; Technical Reference: MX2P225105K275ACPP36004; ComponentLink1Description: Manufacturer Link; ComponentLink1URL: https://www.we-online.com/redexpert/article/890324026027CS?ad; ComponentLink2Description: Datasheet; ComponentLink2URL: https://www.we-online.com/redexpert/spec/890324026027CS?ad; Category: Film Capacitors; Match Code: WCAP-FTX2; Mount: Through Hole; Operating Temperature Max: 105°C; Operating Temperature Min: -40°C; Packaging: Carton; Length: 26mm; Width: 11mm; Height: 20mm; Capacitance: 1uF
footprint WCAP-FTX2_L26W11H20_CS
pins: 1, 2

## 890324026030
designator C?, comment 1.5uF  (value not drawn)
WCAP-FTX2 Film Capacitor, THT, L26W10H21mm, 1.5uF, 275VAC; Manufacturer: Wurth Elektronik; Manufacturer Part Number: 890324026030; Capacitance Tolerance: +/-10%; Dissipation Factor @1kHz: 0.1%; Dissipation Factor @10kHz: 0.7%; Insulation Resistance: 10000Ohm x F; Pitch: 22.5mm; Rate of Voltage Rise: 140V/us; Rated Voltage (AC): 275V; Technical Reference: MX2P225155K275ASPB45000; ComponentLink1Description: Manufacturer Link; ComponentLink1URL: https://www.we-online.com/redexpert/article/890324026030?ad; ComponentLink2Description: Datasheet; ComponentLink2URL: https://www.we-online.com/redexpert/spec/890324026030?ad; Category: Film Capacitors; Match Code: WCAP-FTX2; Mount: Through Hole; Operating Temperature Max: 105°C; Operating Temperature Min: -40°C; Packaging: Carton; Length: 26mm; Width: 10mm; Height: 21mm; Capacitance: 1.5uF
footprint WCAP-FTX2_L26W10H21
pins: 1, 2

## 890324026030CS
designator C?, comment 1.5uF  (value not drawn)
WCAP-FTX2 Film Capacitor, THT, L26W10H21mm, 1.5uF, 275VAC; Manufacturer: Wurth Elektronik; Manufacturer Part Number: 890324026030CS; Capacitance Tolerance: +/-10%; Dissipation Factor @1kHz: 0.1%; Dissipation Factor @10kHz: 0.7%; Insulation Resistance: 10000Ohm x F; Pitch: 22.5mm; Rate of Voltage Rise: 140V/us; Rated Voltage (AC): 275V; Technical Reference: MX2P225155K275ACPP35004; ComponentLink1Description: Manufacturer Link; ComponentLink1URL: https://www.we-online.com/redexpert/article/890324026030CS?ad; ComponentLink2Description: Datasheet; ComponentLink2URL: https://www.we-online.com/redexpert/spec/890324026030CS?ad; Category: Film Capacitors; Match Code: WCAP-FTX2; Mount: Through Hole; Operating Temperature Max: 105°C; Operating Temperature Min: -40°C; Packaging: Carton; Length: 26mm; Width: 10mm; Height: 21mm; Capacitance: 1.5uF
footprint WCAP-FTX2_L26W10H21_CS
pins: 1, 2

## 890324026034
designator C?, comment 2.2uF  (value not drawn)
WCAP-FTX2 Film Capacitor, THT, L26W15H25mm, 2.2uF, 275VAC; Manufacturer: Wurth Elektronik; Manufacturer Part Number: 890324026034; Capacitance Tolerance: +/-10%; Dissipation Factor @1kHz: 0.1%; Dissipation Factor @10kHz: 0.7%; Insulation Resistance: 10000Ohm x F; Pitch: 22.5mm; Rate of Voltage Rise: 170V/us; Rated Voltage (AC): 275V; Technical Reference: MX2P225225K275ASPB46000; ComponentLink1Description: Manufacturer Link; ComponentLink1URL: https://www.we-online.com/redexpert/article/890324026034?ad; ComponentLink2Description: Datasheet; ComponentLink2URL: https://www.we-online.com/redexpert/spec/890324026034?ad; Category: Film Capacitors; Match Code: WCAP-FTX2; Mount: Through Hole; Operating Temperature Max: 105°C; Operating Temperature Min: -40°C; Packaging: Carton; Length: 26mm; Width: 15mm; Height: 25mm; Capacitance: 2.2uF
footprint WCAP-FTX2_L26W15H25
pins: 1, 2

## 890324026034CS
designator C?, comment 2.2uF  (value not drawn)
WCAP-FTX2 Film Capacitor, THT, L26W15H25mm, 2.2uF, 275VAC; Manufacturer: Wurth Elektronik; Manufacturer Part Number: 890324026034CS; Capacitance Tolerance: +/-10%; Dissipation Factor @1kHz: 0.1%; Dissipation Factor @10kHz: 0.7%; Insulation Resistance: 10000Ohm x F; Pitch: 22.5mm; Rate of Voltage Rise: 170V/us; Rated Voltage (AC): 275V; Technical Reference: MX2P225225K275ACPP26004; ComponentLink1Description: Manufacturer Link; ComponentLink1URL: https://www.we-online.com/redexpert/article/890324026034CS?ad; ComponentLink2Description: Datasheet; ComponentLink2URL: https://www.we-online.com/redexpert/spec/890324026034CS?ad; Category: Film Capacitors; Match Code: WCAP-FTX2; Mount: Through Hole; Operating Temperature Max: 105°C; Operating Temperature Min: -40°C; Packaging: Carton; Length: 26mm; Width: 15mm; Height: 25mm; Capacitance: 2.2uF
footprint WCAP-FTX2_L26W15H25_CS
pins: 1, 2

## 890324027006
designator C?, comment 680nF  (value not drawn)
WCAP-FTX2 Film Capacitor, THT, L31W10.5H20mm, 680nF, 275VAC; Manufacturer: Wurth Elektronik; Manufacturer Part Number: 890324027006; Capacitance Tolerance: +/-10%; Dissipation Factor @1kHz: 0.1%; Dissipation Factor @10kHz: 0.7%; Insulation Resistance: 10000Ohm x F; Pitch: 27.5mm; Rate of Voltage Rise: 170V/us; Rated Voltage (AC): 275V; Technical Reference: MX2P275684K275ASPB56000; ComponentLink1Description: Manufacturer Link; ComponentLink1URL: https://www.we-online.com/redexpert/article/890324027006?ad; ComponentLink2Description: Datasheet; ComponentLink2URL: https://www.we-online.com/redexpert/spec/890324027006?ad; Category: Film Capacitors; Match Code: WCAP-FTX2; Mount: Through Hole; Operating Temperature Max: 105°C; Operating Temperature Min: -40°C; Packaging: Carton; Length: 31mm; Width: 10.5mm; Height: 20mm; Capacitance: 680nF
footprint WCAP-FTX2_L31W10.5H20
pins: 1, 2

## 890324027006CS
designator C?, comment 680nF  (value not drawn)
WCAP-FTX2 Film Capacitor, THT, L31W10.5H20mm, 680nF, 275VAC; Manufacturer: Wurth Elektronik; Manufacturer Part Number: 890324027006CS; Capacitance Tolerance: +/-10%; Dissipation Factor @1kHz: 0.1%; Dissipation Factor @10kHz: 0.7%; Insulation Resistance: 10000Ohm x F; Pitch: 27.5mm; Rate of Voltage Rise: 170V/us; Rated Voltage (AC): 275V; Technical Reference: MX2P275684K275ACPP36004; ComponentLink1Description: Manufacturer Link; ComponentLink1URL: https://www.we-online.com/redexpert/article/890324027006CS?ad; ComponentLink2Description: Datasheet; ComponentLink2URL: https://www.we-online.com/redexpert/spec/890324027006CS?ad; Category: Film Capacitors; Match Code: WCAP-FTX2; Mount: Through Hole; Operating Temperature Max: 105°C; Operating Temperature Min: -40°C; Packaging: Carton; Length: 31mm; Width: 10.5mm; Height: 20mm; Capacitance: 680nF
footprint WCAP-FTX2_L31W10.5H20_CS
pins: 1, 2

## 890324027012
designator C?, comment 1.2uF  (value not drawn)
WCAP-FTX2 Film Capacitor, THT, L31W13H22mm, 1.2uF, 275VAC; Manufacturer: Wurth Elektronik; Manufacturer Part Number: 890324027012; Capacitance Tolerance: +/-10%; Dissipation Factor @1kHz: 0.1%; Dissipation Factor @10kHz: 0.7%; Insulation Resistance: 10000Ohm x F; Pitch: 27.5mm; Rate of Voltage Rise: 130V/us; Rated Voltage (AC): 275V; Technical Reference: MX2P275125K275ASPB56000; ComponentLink1Description: Manufacturer Link; ComponentLink1URL: https://www.we-online.com/redexpert/article/890324027012?ad; ComponentLink2Description: Datasheet; ComponentLink2URL: https://www.we-online.com/redexpert/spec/890324027012?ad; Category: Film Capacitors; Match Code: WCAP-FTX2; Mount: Through Hole; Operating Temperature Max: 105°C; Operating Temperature Min: -40°C; Packaging: Carton; Length: 31mm; Width: 13mm; Height: 22mm; Capacitance: 1.2uF
footprint WCAP-FTX2_L31W13H22
pins: 1, 2